# Altium footprint library XU-GENARAL PCB .PcbLib: 1176 footprints (part 73 of 75)
Each footprint in its own frame and in the unit in brackets; x right, y up, seen from the top. Pads: shape width x height; smd on the part's side, far side on the other; paste and mask are expansions set on the pad; w line width, h text height; cw(c..) or ccw(c..) is an arc to the next point about the centre after c.
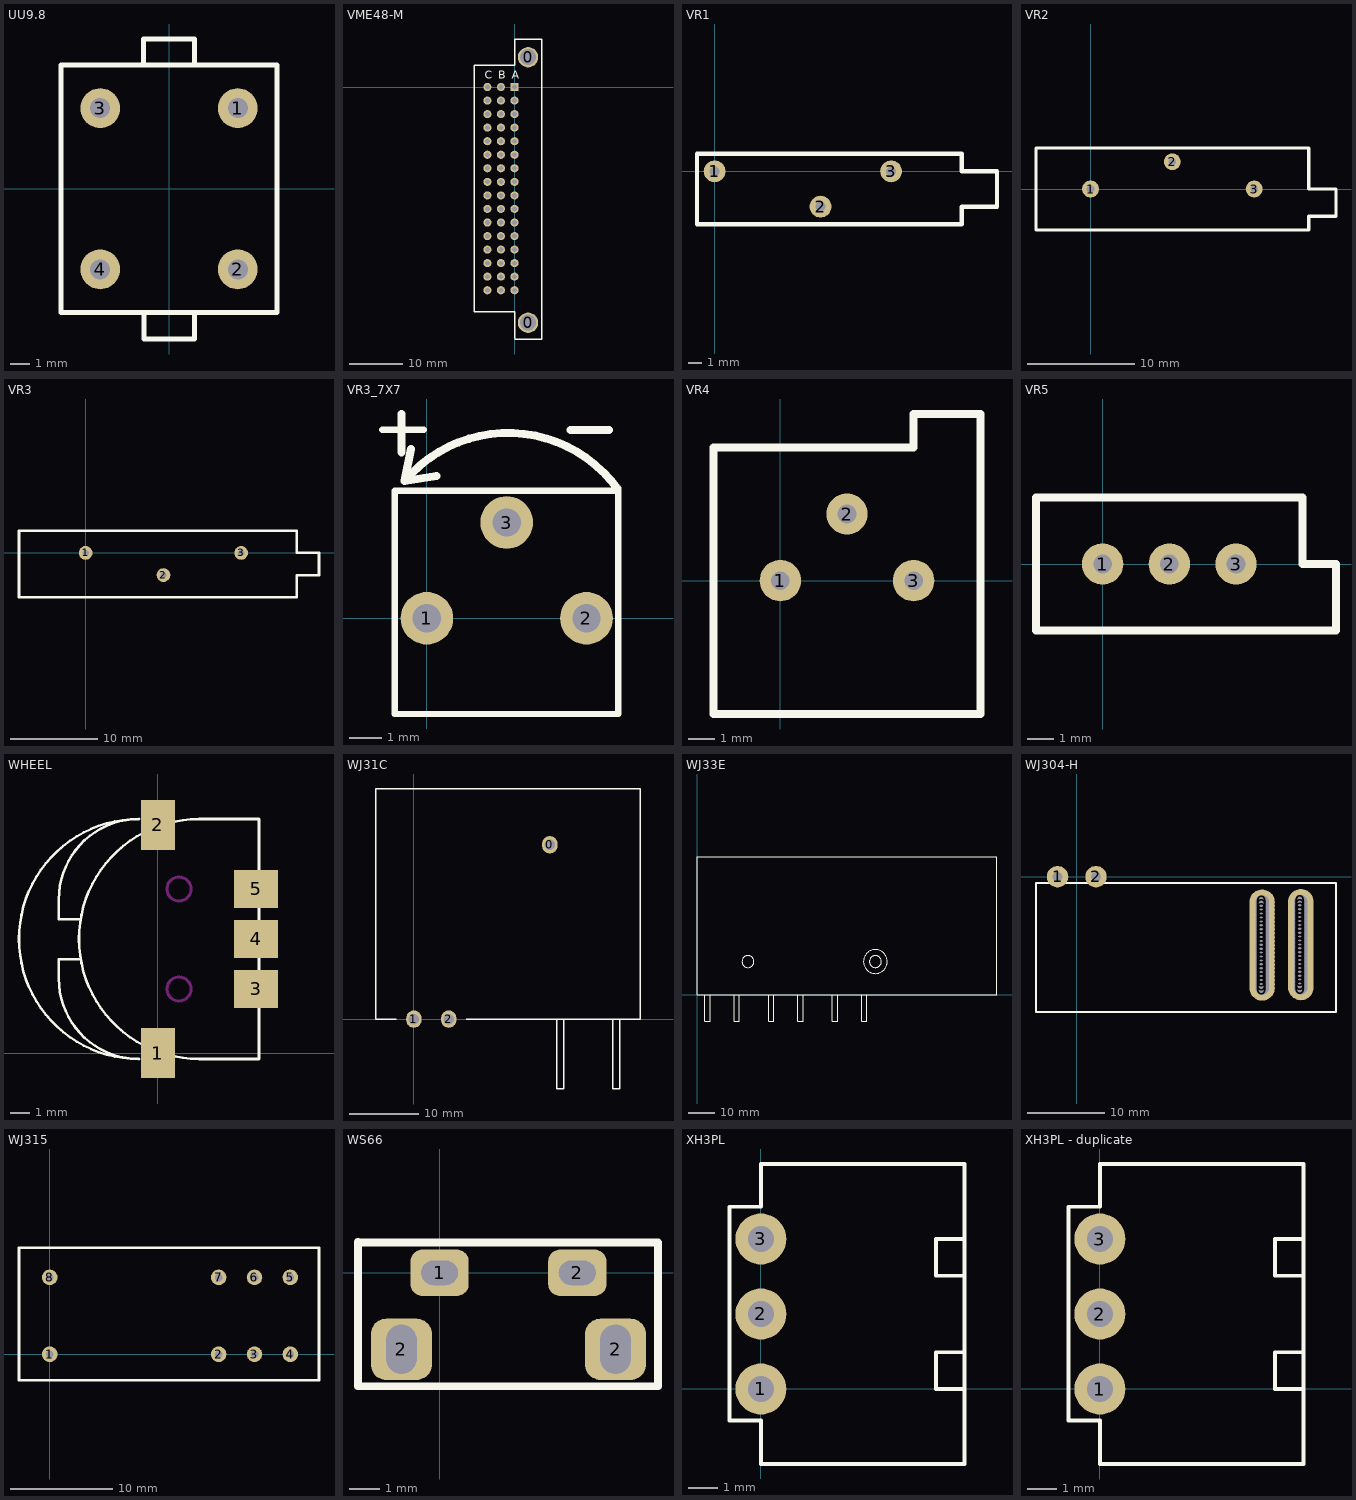
[diagram p72: the footprints below, top view; thin cyan lines are the x and y axes]

## UU9.8 [mil]
pads (4):
  round 80 hole 40: 1(137.8,161.42) 2(137.8,-161.42) 3(-137.8,161.42) 4(-137.8,-161.42)
Top Overlay:
  lines w10: -51,250 -51,300 50,300 51,300 51,248.03 ; -50,-249 -50,-301 51,-301 51,-248.03 ; -216.54,-248.03 -216.54,248.03 216.54,248.03 216.54,-248.03 -216.54,-248.03

## VME48-M [mil]
pads (50):
  round 150 hole 118.11: 0(100,-1740) 0(100,220)
  rect 60x60 hole 35: A1(0,0)
  round 60 hole 35: A2(0,-100) A3(0,-200) A4(0,-300) A5(0,-400) A6(0,-500) A7(0,-600) A8(0,-700) A9(0,-800) A10(0,-900) A11(0,-1000) A12(0,-1100) A13(0,-1200) A14(0,-1300) A15(0,-1400) A16(0,-1500) B1(-100,0) B2(-100,-100) B3(-100,-200) B4(-100,-300) B5(-100,-400) B6(-100,-500) B7(-100,-600) B8(-100,-700) B9(-100,-800) B10(-100,-900) B11(-100,-1000) B12(-100,-1100) B13(-100,-1200) B14(-100,-1300) B15(-100,-1400) B16(-100,-1500) C1(-200,0) C2(-200,-100) C3(-200,-200) C4(-200,-300) C5(-200,-400) C6(-200,-500) C7(-200,-600) C8(-200,-700) C9(-200,-800) C10(-200,-900) C11(-200,-1000) C12(-200,-1100) C13(-200,-1200) C14(-200,-1300) C15(-200,-1400) C16(-200,-1500)
Top Overlay:
  lines w10: 0,-1860 200,-1860 200,-1801.42 200.71,-1800.71 200.71,354.33 0,354.33 0,160 -60,160 -297,160 -297,-1637 -297,-1657 -294,-1660 0,-1660 0,-1854.33
  text "C" at -220,60 h60
  text "B" at -120,60 h60
  text "A" at -20,60 h60

## VR1 [mil]
pads (3):
  round 62 hole 28: 1(0,0) 2(300,-100) 3(500,0)
Top Overlay:
  lines w12: -50,-150 700,-150 700,-100 800,-100 800,0 700,0 700,50 -50,50 -50,-150

## VR2 [mil]
pads (3):
  round 62 hole 28: 1(0,0) 2(300,100) 3(600,0)
Top Overlay:
  lines w12: -200,-150 -200,150 800,150 800,0 900,0 900,-100 800,-100 800,-150 -200,-150

## VR3 [mil]
pads (3):
  round 62 hole 28: 1(0,0) 2(350,-100) 3(700,0)
Top Overlay:
  lines w12: -300,-200 -300,100 950,100 950,0 1050,0 1050,-100 950,-100 950,-200 -300,-200

## VR3_7X7 [mil]
pads (3):
  round 65 hole 35: 1(0,0) 2(196.85,0) 3(98.42,118.11)
Top Overlay:
  lines w8: -55.12,232.28 -3.94,232.28 ; -39.37,-118.11 236.22,-118.11 236.22,157.48 -39.37,157.48 -39.37,-118.11
  lines w10: -31.5,204.72 -31.5,251.97 ; -19.69,208.66 -27.56,169.29 ; 11.88,175.44 -27.56,169.29 ; 177.17,232.28 224.41,232.28 ; 235.08,159.82 ccw(c100.05,61.62) -27.56,169.29

## VR4 [mil]
pads (3):
  round 62 hole 28: 1(0,0) 2(100,100) 3(200,0)
Top Overlay:
  lines w12: -100,-200 300,-200 300,250 200,250 200,200 -100,200 -100,-200

## VR5 [mil]
pads (3):
  round 62 hole 28: 1(0,0) 2(100,0) 3(200,0)
Top Overlay:
  lines w12: -100,-100 350,-100 350,0 300,0 300,100 -100,100 -100,-100

## WHEEL [mm]
pads (5):
  rect 1.7x2.5 smd: 1(0,0) 2(0,11.4)
  rect 2.2x1.9 smd: 3(4.908,3.2) 4(4.908,5.7) 5(4.908,8.2)
Top Overlay:
  lines w0.127: -3.865,4.69 -4.958,4.69 -4.958,3.708 ccw(c-0.95,3.708) -0.95,-0.3 cw(c-0.95,5.7) -6.95,5.7 cw(c-0.95,5.7) -0.95,11.7 ccw(c-0.95,7.692) -4.958,7.692 -4.958,6.696 -3.865,6.696 ; 2.05,11.7 ccw(c2.05,5.7) -3.95,5.7 ccw(c2.05,5.7) 2.05,-0.3 5.05,-0.3 5.05,11.7 2.056,11.7
Keep-Out Layer:
  circle w0.152: c1.05,3.2 r0.6
  circle w0.152: c1.05,8.2 r0.6

## WJ31C [mm]
pads (3):
  oval 2.2x2.5 hole 1.5: 0(19.5,25) 1(0,0) 2(5,0)
Top Overlay:
  lines w0.203: -2.5,0 -5.5,0 -5.5,33 32.5,33 32.5,0 7.5,0 ; 20.5,0 20.5,-10 21.5,-10 21.5,-0.026 ; 28.526,-0.025 28.526,-10.025 29.526,-10.025 29.526,-0.051

## WJ33E [mil]
Top Overlay:
  circle w10: c2645.67,492.13 r177.17
  circle w10: c755.91,492.13 r88.58
  circle w10: c2645.67,492.13 r88.58
  lines w10: 118.11,0 118.11,-393.7 196.85,-393.7 196.85,0 ; 551.18,0 551.18,-393.7 629.92,-393.7 629.92,0 ; 1141.73,0 1141.73,-393.7 1062.99,-393.7 ; 1496.06,0 1496.06,-393.7 1574.8,-393.7 1574.8,0 ; 2007.87,0 2007.87,-393.7 2086.61,-393.7 2086.61,0 ; 2440.94,0 2440.94,-393.7 2519.68,-393.7 2519.68,0 ; 1062.99,-393.7 1062.99,0 1062.99,-393.7 ; 0,0 4448.82,0 4448.82,2047.24 0,2047.24 0,0

## WJ304-H [mil]
pads (48):
  round 130 hole 70: 0(948.82,-569.92) 0(948.82,-549.92) 0(948.82,-529.92) 0(948.82,-509.92) 0(948.82,-489.92) 0(948.82,-469.92) 0(948.82,-449.92) 0(948.82,-429.92) 0(948.82,-409.92) 0(948.82,-389.92) 0(948.82,-369.92) 0(948.82,-349.92) 0(948.82,-329.92) 0(948.82,-309.92) 0(948.82,-289.92) 0(948.82,-269.92) 0(948.82,-249.92) 0(948.82,-229.92) 0(948.82,-209.92) 0(948.82,-189.92) 0(948.82,-169.92) 0(948.82,-149.92) 0(948.82,-129.92) 0(1146.65,-567.95) 0(1146.65,-547.95) 0(1146.65,-527.95) 0(1146.65,-507.95) 0(1146.65,-487.95) 0(1146.65,-467.95) 0(1146.65,-447.95) 0(1146.65,-427.95) 0(1146.65,-407.95) 0(1146.65,-387.95) 0(1146.65,-367.95) 0(1146.65,-347.95) 0(1146.65,-327.95) 0(1146.65,-307.95) 0(1146.65,-287.95) 0(1146.65,-267.95) 0(1146.65,-247.95) 0(1146.65,-227.95) 0(1146.65,-207.95) 0(1146.65,-187.95) 0(1146.65,-167.95) 0(1146.65,-147.95) 0(1146.65,-127.95)
  round 110 hole 50: 1(-98.42,0) 2(98.42,0)
Top Overlay:
  lines w10: -208.66,-692.91 -208.66,-31.5 1326.77,-31.5 1326.77,-692.91 -208.66,-692.91

## WJ315 [mil]
pads (8):
  round 60 hole 30: 1(0,0) 2(649.61,0) 3(787.4,0) 4(925.2,0) 5(925.2,295.28) 6(787.4,295.28) 7(649.61,295.28) 8(0,295.28)
Top Overlay:
  lines w10: -118.11,-100 1035.43,-100 1035.43,409.45 -118.11,409.45 -118.11,-100

## WS66 [mm]
pads (4):
  rrect50% 1.9x1.524 hole 0.8 slot 1.2 at 0 deg: 1(0,0) 2(4.5,0)
  rrect50% 2x2 hole 1 slot 1.6 at 90 deg: 2(-1.25,-2.5)
  rrect50% 2x2 hole 1 slot 1.6 at 90 deg paste+0: 2(5.75,-2.5)
Top Overlay:
  lines w0.254: -2.667,1.016 -2.667,-3.708 7.137,-3.708 7.137,0.991 -2.642,0.991

## XH3PL [mil]
pads (3):
  round 68 hole 35: 1(0,0) 2(0,100) 3(0,200)
Top Overlay:
  lines w5: 271.65,0 233.65,0 233.65,49 271.65,49 ; 271.65,151 233.65,151 233.65,200 271.65,200 ; -42,-42 0,-42 0,-100 136.22,-100 271.65,-100 271.65,300 136.22,300 0,300 0,243 -42,243 -42,-42

## XH3PL - duplicate [mil]
height 43.31
pads (3):
  round 68 hole 35: 1(0,0) 2(0,100) 3(0,200)
Top Overlay:
  lines w5: 271.65,0 233.65,0 233.65,49 271.65,49 ; 271.65,151 233.65,151 233.65,200 271.65,200 ; -42,-42 0,-42 0,-100 136.22,-100 271.65,-100 271.65,300 136.22,300 0,300 0,243 -42,243 -42,-42